# Altium footprint library Calipso V2.0 REV2.0 (new origin)1.PcbLib: 45 footprints (part 2 of 3)
Each footprint in its own frame and in the unit in brackets; x right, y up, seen from the top. Pads: shape width x height; smd on the part's side, far side on the other; paste and mask are expansions set on the pad; w line width, h text height; cw(c..) or ccw(c..) is an arc to the next point about the centre after c.
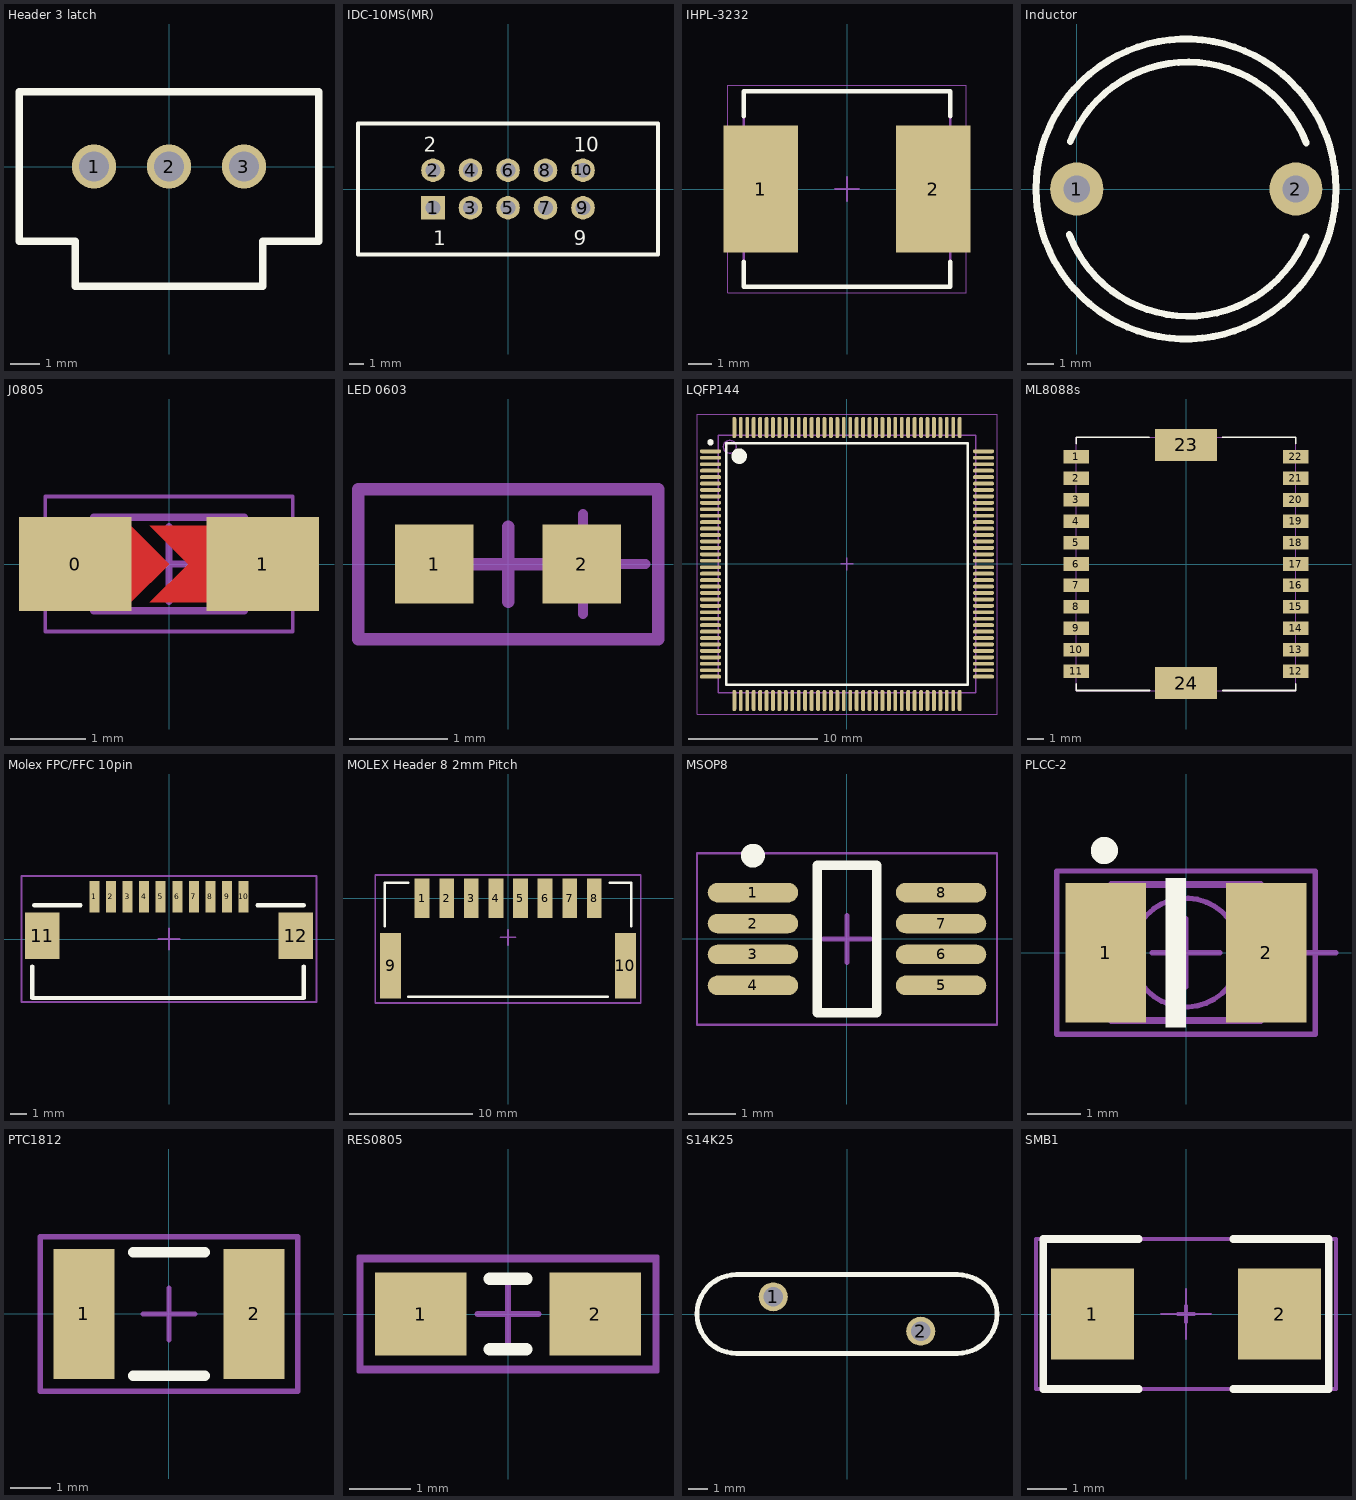
[diagram p1: the footprints below, top view; thin cyan lines are the x and y axes]

## Header 3 latch [mm]
pads (3):
  round 1.5 hole 1: 1(-2.54,0) 2(0,0) 3(2.54,0)
Top Overlay:
  lines w0.254: -5.08,-2.54 -5.08,2.54 5.08,2.54 5.08,-2.54 3.175,-2.54 3.175,-4.064 -3.175,-4.064 -3.175,-2.54 -5.08,-2.54
3D body "header 3 latch.stp": height 13.6, standoff -3.29, extent -5.08,-4.064 5.08,2.54

## IDC-10MS(MR) [mm]
pads (10):
  rect 1.6x1.6 hole 1: 1(-5.08,-1.27)
  round 1.6 hole 1: 2(-5.08,1.27) 3(-2.54,-1.27) 4(-2.54,1.27) 5(0,-1.27) 6(0,1.27) 7(2.54,-1.27) 8(2.54,1.27) 9(5.08,-1.27) 10(5.08,1.27)
Top Overlay:
  lines w0.254: -10.16,-4.445 10.16,-4.445 10.16,4.445 -10.16,4.445 -10.16,-4.445
  text "2" at -5.715,2.54 h1
  text "1" at -5.08,-3.81 h1
  text "9" at 4.445,-3.81 h1
  text "10" at 4.445,2.54 h1
3D body "IDC-10MS.STEP": height 9.41, standoff -3.29, extent -10.2,-4.905 10.2,4.445

## IHPL-3232 [mm]
pads (2):
  rect 3.125x5.334 smd: 1(-3.613,0) 2(3.613,0)
Top Overlay:
  lines w0.2: -4.318,-3.048 -4.318,-4.088 -4.32,-4.09 4.32,-4.09 4.32,-3.05 4.318,-3.048 ; -4.318,3.048 -4.318,4.088 -4.32,4.09 4.32,4.09 4.318,4.088 4.318,3.048
Mechanical 13:
  lines w0.1: -4.32,-4.09 -4.32,4.09 4.32,4.09 4.32,-4.09 -4.32,-4.09
Mechanical 15:
  lines w0.05: -5,-4.35 -5,4.35 5,4.35 5,-4.35 -5,-4.35
  lines w0.1: -0.5,0 0.5,0 ; 0,-0.5 0,0.5
3D body "IHPL-3232.step": height 4, standoff 0, extent -4.32,-4.09 4.32,4.09

## Inductor [mm]
pads (2):
  round 2 hole 1: 1(0,0) 2(8.255,0)
Top Overlay:
  circle w0.254: c4.115,0 r5.65
  lines w0.254: -0.285,-1.712 ccw(c4.191,0) 8.632,-1.801 ; -0.249,1.776 cw(c4.191,0) 8.648,1.733

## J0805 [mm]
pads (2):
  rect 1.5x1.25 smd: 0(-1.25,0) 1(1.25,0)
Top Layer:
  region: -0.508,-0.508 -0.508,0.508 0,0
  region: -0.254,0.508 0.254,0 -0.254,-0.508 0.508,-0.508 0.508,0.508
Top Solder:
  region: -0.508,-0.635 0.508,-0.635 0.508,0.635 -0.508,0.635
  lines w0: -0.508,-0.635 0.508,-0.635 0.508,0.635 -0.508,0.635 -0.508,-0.635
Mechanical 13:
  lines w0.1: -1,-0.625 -1,0.625 1,0.625 1,-0.625 -1,-0.625
Mechanical 15:
  lines w0.05: -1.65,-0.9 -1.65,0.9 1.65,0.9 1.65,-0.9 -1.65,-0.9
  lines w0.1: -0.5,0 0.5,0 ; 0,-0.5 0,0.5
3D body: height 0.75, standoff 0, extent -0.85,-0.625 0.85,0.625
3D body: height 0.75, standoff 0, extent -1,-0.625 -0.85,0.625
3D body: height 0.75, standoff 0, extent 0.85,-0.625 1,0.625

## LED 0603 [mm]
pads (2):
  rect 0.8x0.8 smd: 1(-0.75,0) 2(0.75,0)
Mechanical 13:
  lines w0.1: 0.127,0 1.397,0 ; 0.762,-0.508 0.762,0.508 ; -1.524,-0.762 1.524,-0.762 1.524,0.762 -1.524,0.762 -1.524,-0.762
Mechanical 15:
  lines w0.127: -0.381,0 0.381,0 ; 0,-0.381 0,0.381 ; -1.524,-0.762 -1.524,0.762 1.524,0.762 1.524,-0.762 -1.524,-0.762
3D body "LTST-C190EKT.STEP": height 0.9, standoff 0, extent -0.85,-0.45 0.85,0.45

## LQFP144 [mm]
pads (144):
  oval 1.65x0.3 smd: 1(-10.6,8.75) 2(-10.6,8.25) 3(-10.6,7.75) 4(-10.6,7.25) 5(-10.6,6.75) 6(-10.6,6.25) 7(-10.6,5.75) 8(-10.6,5.25) 9(-10.6,4.75) 10(-10.6,4.25) 11(-10.6,3.75) 12(-10.6,3.25) 13(-10.6,2.75) 14(-10.6,2.25) 15(-10.6,1.75) 16(-10.6,1.25) 17(-10.6,0.75) 18(-10.6,0.25) 19(-10.6,-0.25) 20(-10.6,-0.75) 21(-10.6,-1.25) 22(-10.6,-1.75) 23(-10.6,-2.25) 24(-10.6,-2.75) 25(-10.6,-3.25) 26(-10.6,-3.75) 27(-10.6,-4.25) 28(-10.6,-4.75) 29(-10.6,-5.25) 30(-10.6,-5.75) 31(-10.6,-6.25) 32(-10.6,-6.75) 33(-10.6,-7.25) 34(-10.6,-7.75) 35(-10.6,-8.25) 36(-10.6,-8.75) 73(10.6,-8.75) 74(10.6,-8.25) 75(10.6,-7.75) 76(10.6,-7.25) 77(10.6,-6.75) 78(10.6,-6.25) 79(10.6,-5.75) 80(10.6,-5.25) 81(10.6,-4.75) 82(10.6,-4.25) 83(10.6,-3.75) 84(10.6,-3.25) 85(10.6,-2.75) 86(10.6,-2.25) 87(10.6,-1.75) 88(10.6,-1.25) 89(10.6,-0.75) 90(10.6,-0.25) 91(10.6,0.25) 92(10.6,0.75) 93(10.6,1.25) 94(10.6,1.75) 95(10.6,2.25) 96(10.6,2.75) 97(10.6,3.25) 98(10.6,3.75) 99(10.6,4.25) 100(10.6,4.75) 101(10.6,5.25) 102(10.6,5.75) 103(10.6,6.25) 104(10.6,6.75) 105(10.6,7.25) 106(10.6,7.75) 107(10.6,8.25) 108(10.6,8.75)
  oval 0.3x1.65 smd: 37(-8.75,-10.6) 38(-8.25,-10.6) 39(-7.75,-10.6) 40(-7.25,-10.6) 41(-6.75,-10.6) 42(-6.25,-10.6) 43(-5.75,-10.6) 44(-5.25,-10.6) 45(-4.75,-10.6) 46(-4.25,-10.6) 47(-3.75,-10.6) 48(-3.25,-10.6) 49(-2.75,-10.6) 50(-2.25,-10.6) 51(-1.75,-10.6) 52(-1.25,-10.6) 53(-0.75,-10.6) 54(-0.25,-10.6) 55(0.25,-10.6) 56(0.75,-10.6) 57(1.25,-10.6) 58(1.75,-10.6) 59(2.25,-10.6) 60(2.75,-10.6) 61(3.25,-10.6) 62(3.75,-10.6) 63(4.25,-10.6) 64(4.75,-10.6) 65(5.25,-10.6) 66(5.75,-10.6) 67(6.25,-10.6) 68(6.75,-10.6) 69(7.25,-10.6) 70(7.75,-10.6) 71(8.25,-10.6) 72(8.75,-10.6) 109(8.75,10.6) 110(8.25,10.6) 111(7.75,10.6) 112(7.25,10.6) 113(6.75,10.6) 114(6.25,10.6) 115(5.75,10.6) 116(5.25,10.6) 117(4.75,10.6) 118(4.25,10.6) 119(3.75,10.6) 120(3.25,10.6) 121(2.75,10.6) 122(2.25,10.6) 123(1.75,10.6) 124(1.25,10.6) 125(0.75,10.6) 126(0.25,10.6) 127(-0.25,10.6) 128(-0.75,10.6) 129(-1.25,10.6) 130(-1.75,10.6) 131(-2.25,10.6) 132(-2.75,10.6) 133(-3.25,10.6) 134(-3.75,10.6) 135(-4.25,10.6) 136(-4.75,10.6) 137(-5.25,10.6) 138(-5.75,10.6) 139(-6.25,10.6) 140(-6.75,10.6) 141(-7.25,10.6) 142(-7.75,10.6) 143(-8.25,10.6) 144(-8.75,10.6)
Top Overlay:
  circle w0.25: c-10.6,9.45 r0.125
  circle w0.6: c-8.375,8.375 r0.3
  lines w0.2: -9.375,-9.375 -9.375,9.375 9.375,9.375 9.375,-9.375 -9.375,-9.375
Mechanical 13:
  circle w0.1: c-9.1,9.1 r0.5
  lines w0.1: -10,-10 -10,10 10,10 10,-10 -10,-10
Mechanical 15:
  lines w0.05: -11.65,-11.65 -11.65,11.65 11.65,11.65 11.65,-11.65 -11.65,-11.65
  lines w0.1: -0.5,0 0.5,0 ; 0,-0.5 0,0.5
3D body "LQFP144.step": height 1.6, standoff 0, extent -11.075,-11.075 11.075,11.075

## ML8088s [mm]
pads (24):
  rect 1.5x0.8 smd: 1(-6.5,6.35) 2(-6.5,5.08) 3(-6.5,3.81) 4(-6.5,2.54) 5(-6.5,1.27) 6(-6.5,0) 7(-6.5,-1.27) 8(-6.5,-2.54) 9(-6.5,-3.81) 10(-6.5,-5.08) 11(-6.5,-6.35) 12(6.5,-6.35) 13(6.5,-5.08) 14(6.5,-3.81) 15(6.5,-2.54) 16(6.5,-1.27) 17(6.5,0) 18(6.5,1.27) 19(6.5,2.54) 20(6.5,3.787) 21(6.5,5.08) 22(6.5,6.35)
  rect 3.65x1.9 smd: 23(0,7.05) 24(0,-7.05)
Top Overlay:
  lines w0.1: -6.5,-7.105 -6.5,-7.486 -2.136,-7.486 ; -6.5,7.119 -6.5,7.5 -2.182,7.5 ; 2.136,7.5 6.5,7.5 6.5,7.119 ; 2.182,-7.486 6.5,-7.486 6.5,-7.105
Mechanical 15:
  lines w0.05: -6.5,-7.5 -6.5,7.5 6.5,7.5 6.5,-7.5 -6.5,-7.5

## Molex FPC/FFC 10pin [mm]
pads (12):
  rect 0.6x1.9 smd: 1(-4.5,2.54) 2(-3.5,2.54) 3(-2.5,2.54) 4(-1.5,2.54) 5(-0.5,2.54) 6(0.5,2.54) 7(1.5,2.54) 8(2.5,2.54) 9(3.5,2.54) 10(4.5,2.54)
  rect 2.1x2.8 smd: 11(-7.65,0.19) 12(7.65,0.19)
Top Overlay:
  lines w0.254: -8.255,-1.651 -8.255,-3.556 8.128,-3.556 8.128,-1.651 ; -8.128,2.032 -5.334,2.032 ; 5.334,2.032 8.128,2.032
Mechanical 15:
  lines w0.127: -0.635,0 0.635,0 ; 0,-0.635 0,0.635 ; -8.89,-3.81 -8.89,3.81 8.89,3.81 8.89,-3.81 -8.89,-3.81
3D body "WM11076TR-ND.stp": height 3.1, standoff 0, extent -8.15,-3.53 8.15,3.27

## MOLEX Header 8 2mm Pitch [mm]
pads (10):
  rect 1.2x3.2 smd: 1(-6.985,0) 2(-4.985,0) 3(-2.985,0) 4(-0.985,0) 5(1.015,0) 6(3.015,0) 7(5.015,0) 8(7.015,0)
  rect 1.7x5.3 smd: 9(-9.55,-5.48) 10(9.55,-5.48)
Top Overlay:
  lines w0.2: -10.033,-2.286 -10.033,1.27 -8.128,1.27 ; -8.128,-8.001 8.128,-8.001 ; 8.255,1.27 10.033,1.27 10.033,-2.286
Mechanical 15:
  lines w0.127: -0.635,-3.175 0.635,-3.175 ; 0,-3.81 0,-2.54 ; -10.795,-8.509 -10.795,1.905 10.795,1.905 10.795,-8.509 -10.795,-8.509
3D body "Header 8 Male 2mm Pitch.stp": height 6.41, standoff 0.01, extent -10,-8.075 10,1.325

## MSOP8 [mm]
pads (8):
  oval 1.9x0.41 smd: 1(-1.975,0.975) 2(-1.975,0.325) 3(-1.975,-0.325) 4(-1.975,-0.975) 5(1.975,-0.975) 6(1.975,-0.325) 7(1.975,0.325) 8(1.975,0.975)
Top Overlay:
  circle w0.25: c-1.975,1.75 r0.125
  lines w0.2: -0.625,-1.55 0.625,-1.55 0.625,1.55 -0.625,1.55 -0.625,-1.55
Mechanical 15:
  lines w0.05: -3.15,-1.8 3.15,-1.8 3.15,1.8 -3.15,1.8 -3.15,-1.8
  lines w0.1: -0.5,0 0.5,0 ; 0,-0.5 0,0.5
3D body "MSOP8.STEP": height 1.15, standoff 0, extent -2.45,-1.5 2.45,1.5

## PLCC-2 [mm]
pads (2):
  rect 1.5x2.6 smd: 1(-1.5,0) 2(1.5,0)
Top Overlay:
  circle w0.254: c-1.524,1.905 r0.127
  rectangle: -0.381,-1.397 0,1.397
Mechanical 13:
  circle w0.1: c0,0 r1.016
  lines w0.1: 1.524,0 2.794,0 ; 2.159,-0.635 2.159,0.635
  lines w0.127: -1.397,-1.27 -1.397,1.27 1.397,1.27 1.397,-1.27 -1.397,-1.27
Mechanical 15:
  lines w0.1: -0.635,0 0.635,0 ; 0,-0.635 0,0.635 ; -2.413,-1.524 2.413,-1.524 2.413,1.524 -2.413,1.524 -2.413,-1.524
3D body "User Library-HSMx-A10x-xxxxx SMD LED PLCC-2.STEP": height 1.91, standoff 0.01, extent -1.75,-1.4 1.75,1.4

## PTC1812 [mm]
pads (2):
  rect 1.5x3.2 smd: 1(-2.1,0) 2(2.1,0)
Top Overlay:
  lines w0.254: -0.889,-1.524 0.889,-1.524 ; -0.889,1.524 0.889,1.524
Mechanical 15:
  lines w0.127: -0.635,0 0.635,0 ; 0,-0.635 0,0.635 ; -3.175,-1.905 3.175,-1.905 3.175,1.905 -3.175,1.905 -3.175,-1.905
3D body "PTC1812X0_7MM.STEP": height 0.68, standoff -0.02, extent -2.25,-1.6 2.25,1.6

## RES0805 [mm]
pads (2):
  rect 1.5x1.35 smd: 1(-1.425,0) 2(1.425,0)
Top Overlay:
  lines w0.2: -0.3,-0.575 0.3,-0.575 ; -0.3,0.575 0.3,0.575
Mechanical 13:
  lines w0.1: -2.413,-0.889 -2.413,0.889 2.413,0.889 2.413,-0.889 -2.413,-0.889
Mechanical 15:
  lines w0.05: -2.45,-0.95 -2.45,0.95 2.45,0.95 2.45,-0.95 -2.45,-0.95
  lines w0.1: -0.5,0 0.5,0 ; 0,-0.5 0,0.5
3D body "RES-0805.STEP": height 0.76, standoff 0, extent -1.15,-0.675 1.15,0.675

## S14K25 [mm]
pads (2):
  round 1.5 hole 1: 1(-3.81,0.889) 2(3.81,-0.889)
Top Overlay:
  lines w0.254: -5.715,-2.032 cw(c-5.715,0) -5.715,2.032 5.715,2.032 cw(c5.715,0) 5.715,-2.032 -5.715,-2.032
3D body "User Library-S14K25 MOV.STEP": height 18.5, standoff -3, extent -7.75,-2.1 7.75,2.1

## SMB1 [mm]
pads (2):
  rect 2.1x2.3 smd: 1(-2.375,0) 2(2.375,0)
Top Overlay:
  lines w0.2: -1.2,-1.905 -3.625,-1.905 -3.625,1.905 -1.2,1.905 ; 1.2,-1.905 3.625,-1.905 3.625,1.905 1.2,1.905
Mechanical 1:
  lines w0.1: -0.2,0 0.2,0 ; 0,-0.2 0,0.2
Mechanical 13:
  lines w0.1: -3.175,0 -1.905,0 ; -2.54,-0.635 -2.54,0.635 ; -3.81,-1.905 -3.81,1.905 3.81,1.905 3.81,-1.905 -3.81,-1.905
Mechanical 15:
  lines w0.05: -0.635,0 0.635,0 ; 0,-0.635 0,0.635 ; -3.81,-1.905 3.81,-1.905 3.81,1.905 -3.81,1.905 -3.81,-1.905
  lines w0.1: -3.175,0 -1.905,0 ; -2.54,-0.635 -2.54,0.635
3D body "SW3dPS-DO-214AA SMB.STEP": height 2.3, standoff 0, extent -2.7,-1.8 2.7,1.8